# Altium footprint library dcdc_ldo_ref.pcblib: 50 footprints (part 4 of 4)
Each footprint in its own frame and in the unit in brackets; x right, y up, seen from the top. Pads: shape width x height; smd on the part's side, far side on the other; paste and mask are expansions set on the pad; w line width, h text height; cw(c..) or ccw(c..) is an arc to the next point about the centre after c.
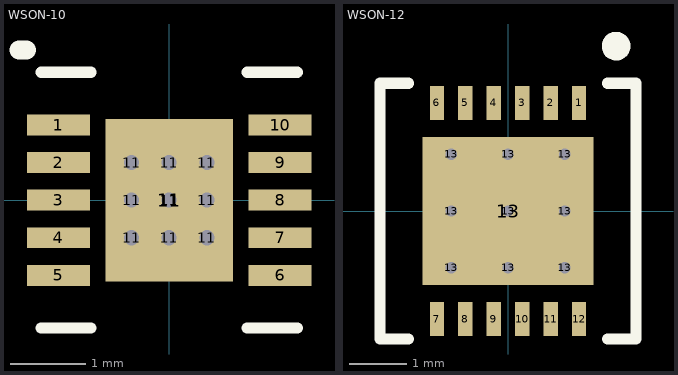
[diagram p3: the footprints below, top view; thin cyan lines are the x and y axes]

## WSON-10 [mm] "wson10"
height 0.8
pads (20):
  rect 0.838x0.279 smd mask-25.4: 1(-1.475,1) 2(-1.475,0.5) 3(-1.475,0) 4(-1.475,-0.5) 5(-1.475,-1) 6(1.475,-1) 7(1.475,-0.5) 8(1.475,0) 9(1.475,0.5) 10(1.475,1)
  round 0.3 hole 0.2 mask+0: 11(-0.5,-0.5) 11(-0.5,0) 11(-0.5,0.5) 11(0,-0.5) 11(0,0) 11(0,0.5) 11(0.5,-0.5) 11(0.5,0) 11(0.5,0.5)
  rect 1.702x2.159 smd mask-25.4: 11(0,0)
Top Overlay:
  lines w0.152: -1.702,-1.702 -1.041,-1.702 ; -1.702,1.702 -1.041,1.702 ; 1.041,-1.702 1.702,-1.702 ; 1.041,1.702 1.702,1.702
  lines w0.254: -2,2 -1.9,2
Top Solder:
  region: -1.994,0.76 -0.956,0.76 -0.956,1.24 -1.994,1.24
  region: -1.994,0.26 -0.956,0.26 -0.956,0.74 -1.994,0.74
  region: -1.994,-0.24 -0.956,-0.24 -0.956,0.24 -1.994,0.24
  region: -1.994,-0.74 -0.956,-0.74 -0.956,-0.26 -1.994,-0.26
  region: -1.994,-1.24 -0.956,-1.24 -0.956,-0.76 -1.994,-0.76
  region: 0.956,-1.24 1.994,-1.24 1.994,-0.76 0.956,-0.76
  region: 0.956,-0.74 1.994,-0.74 1.994,-0.26 0.956,-0.26
  region: 0.956,-0.24 1.994,-0.24 1.994,0.24 0.956,0.24
  region: 0.956,0.26 1.994,0.26 1.994,0.74 0.956,0.74
  region: 0.956,0.76 1.994,0.76 1.994,1.24 0.956,1.24
  region: -0.951,-1.179 0.951,-1.179 0.951,1.179 -0.951,1.179
Board:
  lines w0.127: -0.203,-0.406 cw(c-0.394,-0.406) -0.584,-0.406 cw(c-0.394,-0.394) -0.203,-0.38 ; 0.584,-0.406 cw(c0.394,-0.406) 0.203,-0.406 cw(c0.394,-0.394) 0.584,-0.38 ; -0.584,0.38 ccw(c-0.394,0.394) -0.203,0.407 ccw(c-0.394,0.394) -0.584,0.38 ; 0.203,0.38 ccw(c0.394,0.394) 0.584,0.407 ccw(c0.394,0.394) 0.203,0.38
3D body "User Library-SON10_3x3x0_8mm.step": height 0.8, standoff 0, extent -1.501,-1.501 1.501,1.501

## WSON-12 [mm] "WSON-12"
height 0.8
pads (22):
  rect 0.25x0.6 smd: 1(1.25,1.9) 2(0.75,1.9) 3(0.25,1.9) 4(-0.25,1.9) 5(-0.75,1.9) 6(-1.25,1.9) 7(-1.25,-1.9) 8(-0.75,-1.9) 9(-0.25,-1.9) 10(0.25,-1.9) 11(0.75,-1.9) 12(1.25,-1.9)
  round 0.3 hole 0.2 mask+0: 13(-1,-1) 13(-1,0) 13(-1,1) 13(0,-1) 13(0,0) 13(0,1) 13(1,-1) 13(1,0) 13(1,1)
  rect 3x2.6 smd: 13(0,0)
Top Overlay:
  circle w0.254: c1.9,2.9 r0.125
  lines w0.2: -1.75,-2.25 -2.25,-2.25 -2.25,2.25 -1.75,2.25 ; 1.75,-2.25 2.25,-2.25 2.25,2.25 1.75,2.25
3D body "User Library-LP39798-2.step": height 0.8, standoff 0, extent -2,-2 2,2